# Altium footprint library CoilcraftPCB.PcbLib: 321 footprints (part 21 of 21)
Each footprint in its own frame and in the unit in brackets; x right, y up, seen from the top. Pads: shape width x height; smd on the part's side, far side on the other; paste and mask are expansions set on the pad; w line width, h text height; cw(c..) or ccw(c..) is an arc to the next point about the centre after c.
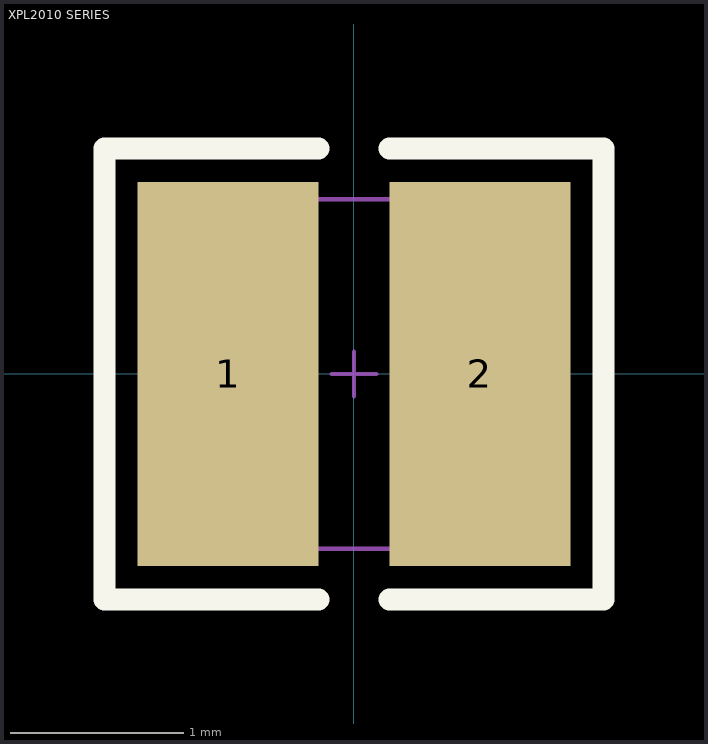
[diagram p20: the footprint, top view; thin cyan lines are the x and y axes]

## XPL2010 SERIES [mil] "Coilcraft SMT Power Inductors"
height 39
pads (2):
  rect 41x87 smd: 1(-28.5,0) 2(28.5,0)
Top Overlay:
  lines w5: -8,-51 -56.5,-51 -56.5,51 -8,51 ; 8,-51 56.5,-51 56.5,51 8,51
Mechanical 13:
  lines w1: -5,0 5,0 ; 0,-5 0,5
Mechanical 14:
  lines w1: -37.5,-39.5 37.5,-39.5 37.5,39.5 -37.5,39.5 -37.5,-39.5
3D body "XPL2010.STEP": height 51.21, standoff 0.03, extent -43.3,-41.33 43.31,41.34